# Altium footprint library SOT SOD TO DAPK.PcbLib: 156 footprints (part 3 of 10)
Each footprint in its own frame and in the unit in brackets; x right, y up, seen from the top. Pads: shape width x height; smd on the part's side, far side on the other; paste and mask are expansions set on the pad; w line width, h text height; cw(c..) or ccw(c..) is an arc to the next point about the centre after c.
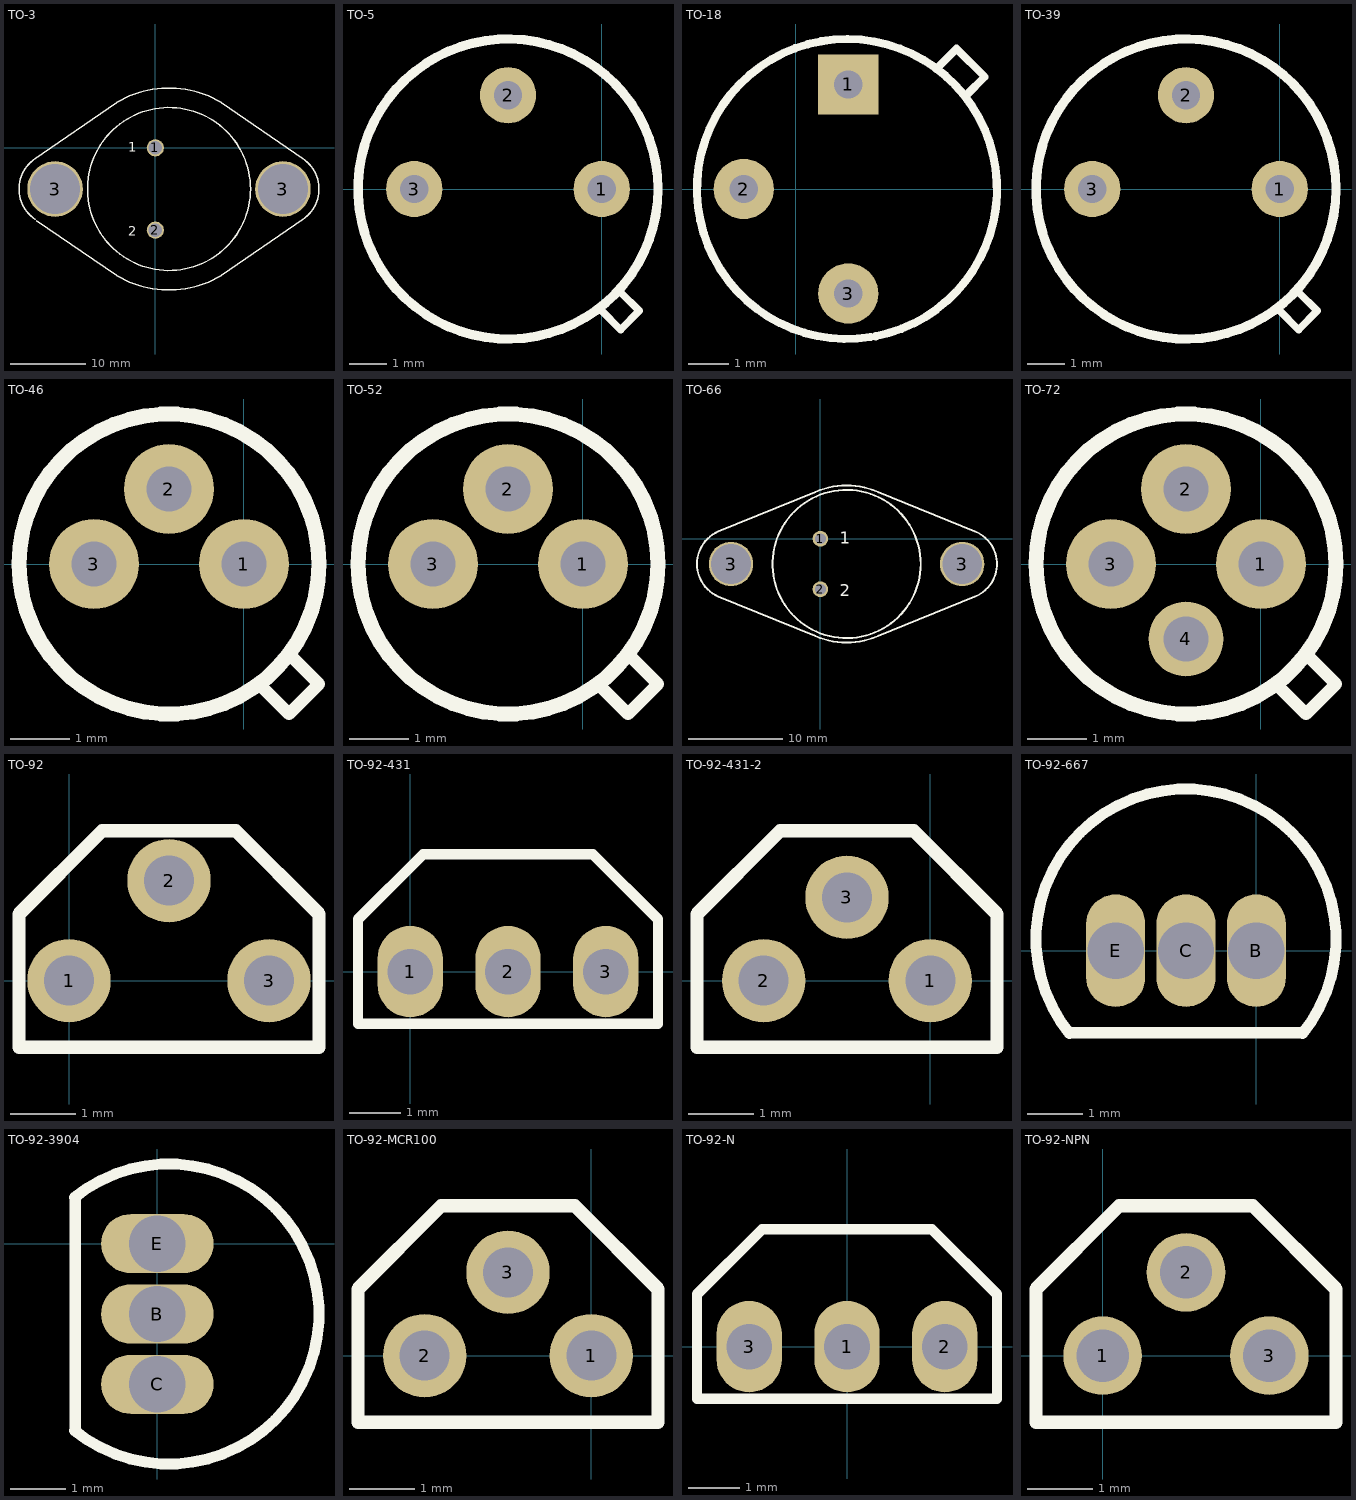
[diagram p2: the footprints below, top view; thin cyan lines are the x and y axes]

## TO-3 [mil]
pads (4):
  round 90 hole 70: 1(0,0) 2(0,-430)
  round 290 hole 262: 3(-523.5,-215) 3(666.5,-215)
Top Overlay:
  circle w7.87: c71.5,-215 r425.69
  lines w7.87: -628.5,-56.67 -203.5,235 ; -627.34,-373.9 cw(c-520.17,-215) -627.34,-56.1 ; -620.17,-381.67 -203.5,-665 ; -200.18,-667.16 ccw(c71.5,-215) 343.18,-667.16 ; -200.18,237.16 cw(c71.5,-215) 343.18,237.16 ; 346.5,-665 771.5,-373.33 ; 346.5,235 771.5,-56.67 ; 770.34,-373.9 ccw(c663.17,-215) 770.34,-56.1
  text "1" at -140,-20 h50
  text "2" at -140,-460 h50

## TO-5 [mil]
pads (3):
  round 60 hole 30: 1(0,0) 2(-100,100) 3(-200,0)
Top Overlay:
  circle w10: c-100,0 r160
  lines w8: 0,-130 20,-150 40,-130 20,-110

## TO-18 [mm]
pads (3):
  rect 1.5x1.5 hole 0.7: 1(1.302,2.603)
  round 1.5 hole 0.7: 2(-1.302,0) 3(1.302,-2.603)
Top Overlay:
  lines w0.2: 3.492,2.984 4,3.492 4.699,2.794 4.255,2.349
  lines w0.203: 1.856,-3.689 cw(c1.27,0) 1.985,-3.666
3D body "TO-18_2N2222.step": height 6.6, standoff -1.79, extent -1.53,-2.8 4.078,2.808

## TO-39 [mil]
pads (3):
  round 60 hole 30: 1(0,0) 2(-100,100) 3(-200,0)
Top Overlay:
  circle w10: c-100,0 r160
  lines w8: 0,-130 20,-150 40,-130 20,-110
3D body "User Library-TO-39_2N2218.STEP": height 275.59, standoff -98.43, extent -278.82,-170.31 73.9,184.02

## TO-46 [mil]
pads (3):
  round 60 hole 30: 1(0,0) 2(-50,50) 3(-100,0)
Top Overlay:
  circle w10: c-50,0 r100
  lines w8: 10,-80 30,-100 50,-80 30,-60

## TO-52 [mil]
pads (3):
  round 60 hole 30: 1(0,0) 2(-50,50) 3(-100,0)
Top Overlay:
  circle w10: c-50,0 r100
  lines w8: 10,-80 30,-100 50,-80 30,-60
3D body "User Library-TO-52.STEP": height 180.31, standoff -480.31, extent -229.37,-174.79 122.23,176.81

## TO-66 [mil]
pads (4):
  round 65 hole 45: 1(0,0) 2(0,-210)
  round 185 hole 165: 3(-372,-105) 3(590,-105)
Top Overlay:
  circle w7.87: c109,-105 r308.33
  lines w7.87: -426,-240 -21,-405 ; -425.99,-239.75 cw(c-366,-105) -425.99,29.75 ; -426,30 -21,195 ; -18.64,-405.7 ccw(c109,-105) 236.64,-405.7 ; -18.64,195.7 cw(c109,-105) 236.64,195.7 ; 239,-405 644,-240 ; 239,195 644,30 ; 643.63,-240.21 ccw(c589,-105) 643.63,30.21
  text "2" at 80,-240 h50
  text "1" at 80,-20 h50
3D body "SW3dPS-TO-66.STEP": height 239.11, standoff -391.82, extent -516.77,-450.3 723.59,237.71

## TO-72 [mil]
pads (4):
  round 60 hole 30: 1(0,0) 2(-50,50) 3(-100,0)
  round 50 hole 30: 4(-50,-50)
Top Overlay:
  circle w10: c-50,0 r100
  lines w8: 10,-80 30,-100 50,-80 30,-60

## TO-92 [mil]
pads (3):
  round 50 hole 30: 1(0,0) 2(60,60) 3(120,0)
Top Overlay:
  lines w8: -30,-40 -30,40 20,90 100,90 150,40 150,-40 -30,-40
3D body "micromsd_n.stp": height 269.29, standoff -118.11, extent -33.7,-52.83 144.25,81.02

## TO-92-431 [mil]
pads (3):
  oval 50x70 hole 35: 1(0,0) 2(75,0) 3(150,0)
Top Overlay:
  lines w8: -40,-40 190,-40 190,40 140,90 10,90 -40,40 -40,-40
3D body "micromsd_n.stp": height 269.29, standoff -118.11, extent -23.7,-47.83 154.25,86.02

## TO-92-431-2 [mil]
pads (3):
  round 50 hole 30: 1(0,0) 2(-100,0) 3(-50,50)
Top Overlay:
  lines w8: -140,-40 40,-40 40,40 -10,90 -90,90 -140,40 -140,-40
3D body "TO-92B.STEP": height 314.96, standoff -119.01, extent -144.49,-44.88 44.49,109.84

## TO-92-667 [mil]
pads (3):
  oval 42x80 hole 40: B(0,0) C(-50,0) E(-100,0)
Top Overlay:
  lines w7.87: -133.33,-58.33 33.33,-58.33 ; -132.9,-58.79 cw(c-50,8.33) 32.9,-58.79
3D body "TO-92B.STEP": height 314.96, standoff -119.01, extent -144.49,-54.88 44.49,99.84

## TO-92-3904 [mil]
pads (3):
  oval 80x42 hole 40: B(0,-50) C(0,-100) E(0,0)
Top Overlay:
  lines w7.87: -58.79,-132.9 ccw(c8.33,-50) -58.79,32.9 ; -58.33,-133.33 -58.33,33.33
3D body "TO-92B.STEP": height 314.96, standoff -119.01, extent -64.88,-144.49 89.84,44.49

## TO-92-MCR100 [mil]
pads (3):
  round 50 hole 30: 1(0,0) 2(-100,0) 3(-50,50)
Top Overlay:
  lines w8: -140,-40 40,-40 40,40 -10,90 -90,90 -140,40 -140,-40
3D body "TO-92B.STEP": height 314.96, standoff -119.01, extent -144.49,-44.88 44.49,109.84

## TO-92-N [mil]
pads (3):
  oval 50x70 hole 35: 1(0,0) 2(75,0) 3(-75,0)
Top Overlay:
  lines w8: -115,-40 -115,40 -65,90 65,90 115,40 115,-40 -115,-40
3D body "NPN TO-92 3L (2 54mm).step": height 268.7, standoff -500, extent -93.85,-51.47 93.55,91.45

## TO-92-NPN [mm]
pads (3):
  round 1.2 hole 0.8: 1(0,0) 2(1.27,1.27) 3(2.54,0)
Top Overlay:
  lines w0.203: -1.016,-1.016 -1.016,1.016 0.254,2.286 2.286,2.286 3.556,1.016 3.556,-1.016 -1.016,-1.016
3D body "TO-92B.STEP": height 8, standoff -3.02, extent -1.13,-1.14 3.67,2.79